# Altium integrated library WR-FPC_rev15a.intlib: 146 symbols (part 1 of 2) (continued)
## WE-ZIF Connector WR-FPC 68712014522
designator C?
WR-FPC 0.50mm SMT ZIF Horizontal Bottom Contact; Manufacturer: Würth Elektronik eiSos GmbH; ComponentLink1 Description: Manufacturer; ComponentLink2 Description: Datasheet; NoPins: 20; Created Date: 28 October 2013; partNo: 68712014522; ComponentLink1URL: http://www.we-online.com; ComponentLink2URL: http://katalog.we-online.de/em/datasheet/6871xx14522.pdf; Created by: Karrer Zheng
footprint 68712014522 (20 pins)
pins: 1, 2, 3, 4, 5, 6, 7, 8, 9, 10, 11, 12, 13, 14, 15, 16, 17, 18, 19, 20

## WE-ZIF Connector WR-FPC 68712214522
designator C?
WR-FPC 0.50mm SMT ZIF Horizontal Bottom Contact; Manufacturer: Würth Elektronik eiSos GmbH; ComponentLink1 Description: Manufacturer; ComponentLink2 Description: Datasheet; NoPins: 22; Created Date: 28 October 2013; partNo: 68712214522; ComponentLink1URL: http://www.we-online.com; ComponentLink2URL: http://katalog.we-online.de/em/datasheet/6871xx14522.pdf; Created by: Karrer Zheng
footprint 68712214522 (22 pins)
pins: 1, 2, 3, 4, 5, 6, 7, 8, 9, 10, 11, 12, 13, 14, 15, 16, 17, 18, 19, 20, 21, 22

## WE-ZIF Connector WR-FPC 68712414522
designator C?
WR-FPC 0.50mm SMT ZIF Horizontal Bottom Contact; Manufacturer: Würth Elektronik eiSos GmbH; ComponentLink1 Description: Manufacturer; ComponentLink2 Description: Datasheet; NoPins: 24; Created Date: 28 October 2013; partNo: 68712414522; ComponentLink1URL: http://www.we-online.com; ComponentLink2URL: http://katalog.we-online.de/em/datasheet/6871xx14522.pdf; Created by: Karrer Zheng
footprint 68712414522 (24 pins)
pins: 1, 2, 3, 4, 5, 6, 7, 8, 9, 10, 11, 12, 13, 14, 15, 16, 17, 18, 19, 20, 21, 22, 23, 24

## WE-ZIF Connector WR-FPC 68712614522
designator C?
WR-FPC 0.50mm SMT ZIF Horizontal Bottom Contact; Manufacturer: Würth Elektronik eiSos GmbH; ComponentLink1 Description: Manufacturer; ComponentLink2 Description: Datasheet; NoPins: 26; Created Date: 28 October 2013; partNo: 68712614522; ComponentLink1URL: http://www.we-online.com; ComponentLink2URL: http://katalog.we-online.de/em/datasheet/6871xx14522.pdf; Created by: Karrer Zheng
footprint 68712614522 (26 pins)
pins: 1, 2, 3, 4, 5, 6, 7, 8, 9, 10, 11, 12, 13, 14, 15, 16, 17, 18, 19, 20, 21, 22, 23, 24, 25, 26

## WE-ZIF Connector WR-FPC 68712814522
designator C?
WR-FPC 0.50mm SMT ZIF Horizontal Bottom Contact; Manufacturer: Würth Elektronik eiSos GmbH; ComponentLink1 Description: Manufacturer; ComponentLink2 Description: Datasheet; NoPins: 28; Created Date: 28 October 2013; partNo: 68712814522; ComponentLink1URL: http://www.we-online.com; ComponentLink2URL: http://katalog.we-online.de/em/datasheet/6871xx14522.pdf; Created by: Karrer Zheng
footprint 68712814522 (28 pins)
pins: 1, 2, 3, 4, 5, 6, 7, 8, 9, 10, 11, 12, 13, 14, 15, 16, 17, 18, 19, 20, 21, 22, 23, 24, 25, 26, 27, 28

## WE-ZIF Connector WR-FPC 68713014522
designator C?
WR-FPC 0.50mm SMT ZIF Horizontal Bottom Contact; Manufacturer: Würth Elektronik eiSos GmbH; ComponentLink1 Description: Manufacturer; ComponentLink2 Description: Datasheet; NoPins: 30; Created Date: 28 October 2013; partNo: 68713014522; ComponentLink1URL: http://www.we-online.com; ComponentLink2URL: http://katalog.we-online.de/em/datasheet/6871xx14522.pdf; Created by: Karrer Zheng
footprint 68713014522 (30 pins)
pins: 1, 2, 3, 4, 5, 6, 7, 8, 9, 10, 11, 12, 13, 14, 15, 16, 17, 18, 19, 20, 21, 22, 23, 24, 25, 26, 27, 28, 29, 30

## WE-ZIF Connector WR-FPC 68713214522
designator C?
WR-FPC 0.50mm SMT ZIF Horizontal Bottom Contact; Manufacturer: Würth Elektronik eiSos GmbH; ComponentLink1 Description: Manufacturer; ComponentLink2 Description: Datasheet; NoPins: 32; Created Date: 28 October 2013; partNo: 68713214522; ComponentLink1URL: http://www.we-online.com; ComponentLink2URL: http://katalog.we-online.de/em/datasheet/6871xx14522.pdf; Created by: Karrer Zheng
footprint 68713214522 (32 pins)
pins: 1, 2, 3, 4, 5, 6, 7, 8, 9, 10, 11, 12, 13, 14, 15, 16, 17, 18, 19, 20, 21, 22, 23, 24, 25, 26, 27, 28, 29, 30, 31, 32

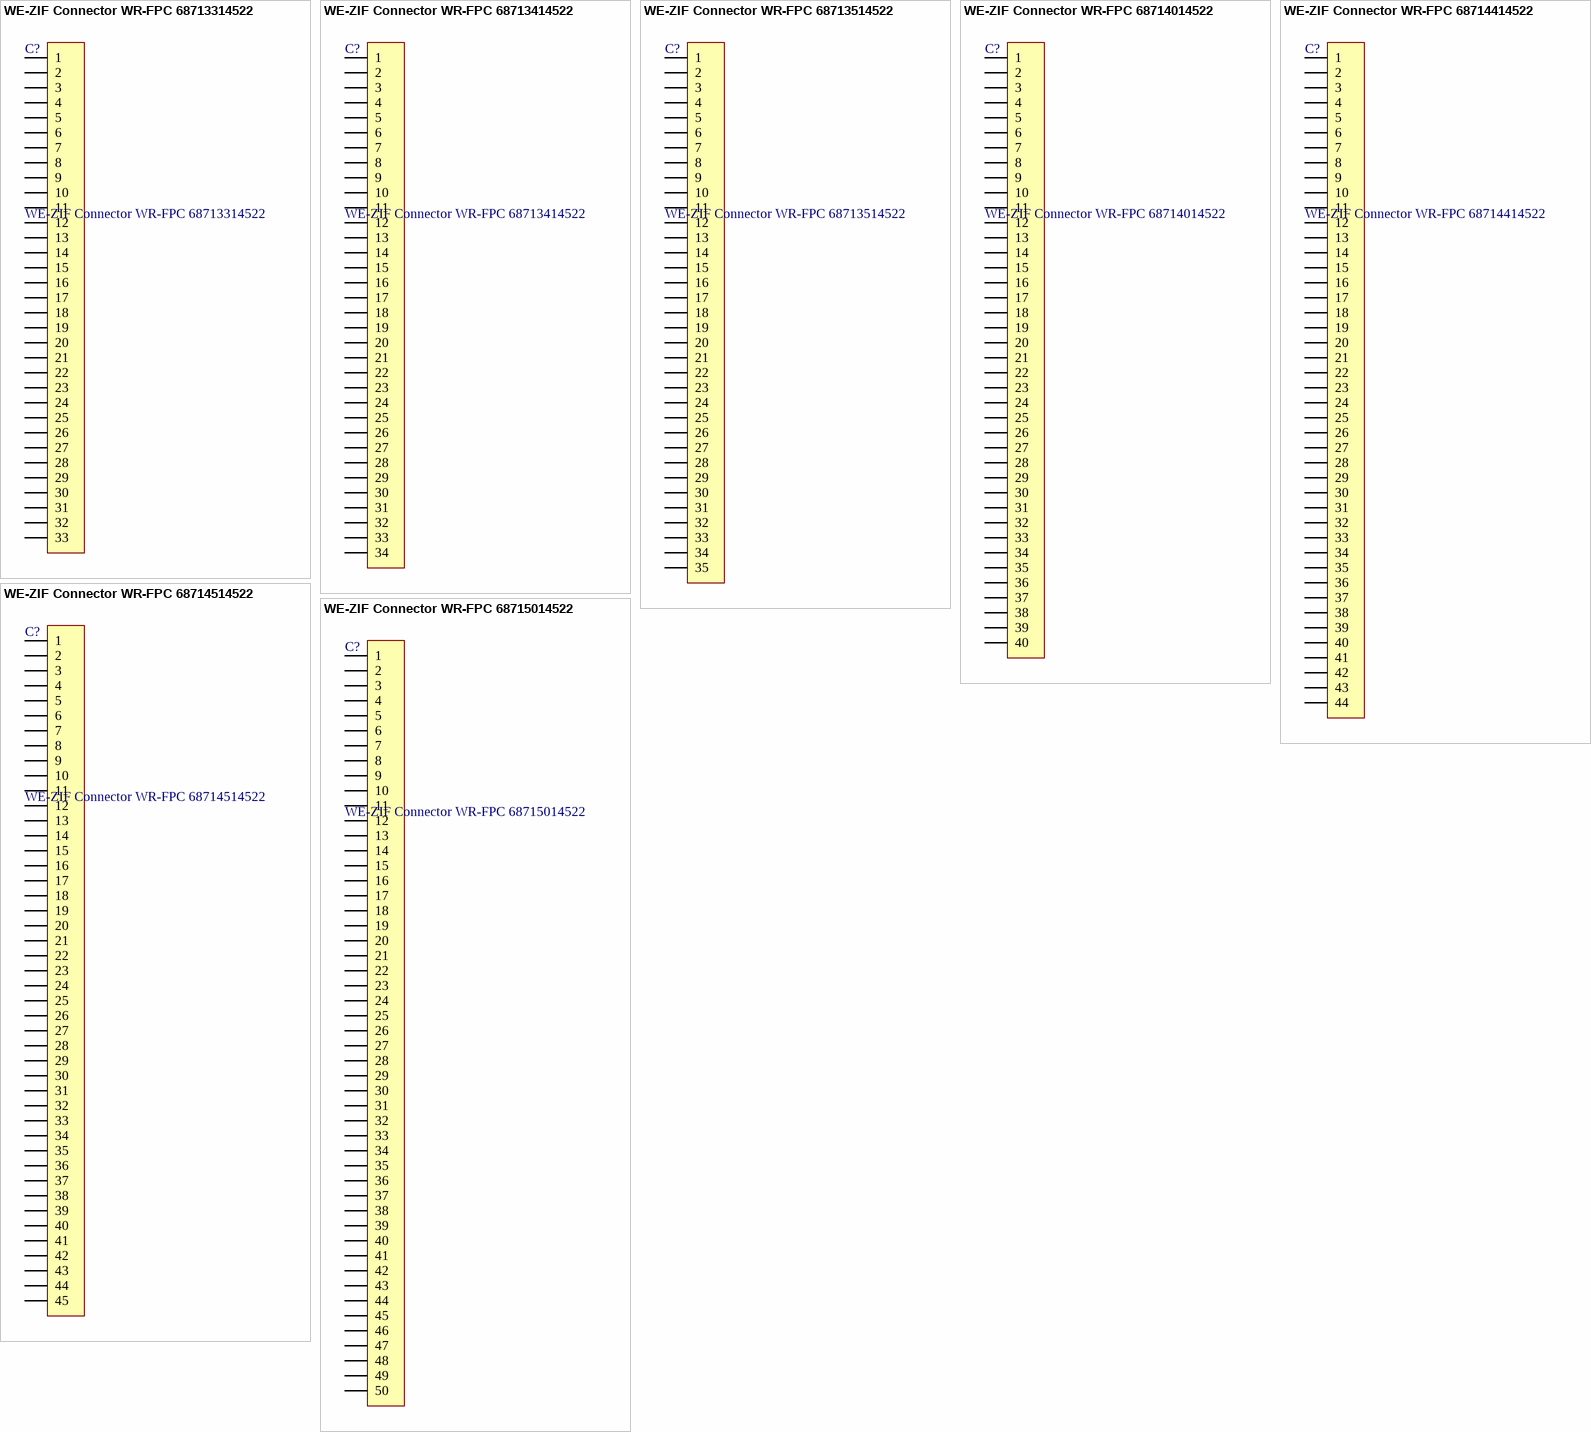
[diagram p7: symbols WE-ZIF Connector WR-FPC 68713314522 to WE-ZIF Connector WR-FPC 68715014522]

## WE-ZIF Connector WR-FPC 68713314522
designator C?
WR-FPC 0.50mm SMT ZIF Horizontal Bottom Contact; Manufacturer: Würth Elektronik eiSos GmbH; ComponentLink1 Description: Manufacturer; ComponentLink2 Description: Datasheet; NoPins: 33; Created Date: 28 October 2013; partNo: 68713314522; ComponentLink1URL: http://www.we-online.com; ComponentLink2URL: http://katalog.we-online.de/em/datasheet/6871xx14522.pdf; Created by: Karrer Zheng
footprint 68713314522 (33 pins)
pins: 1, 2, 3, 4, 5, 6, 7, 8, 9, 10, 11, 12, 13, 14, 15, 16, 17, 18, 19, 20, 21, 22, 23, 24, 25, 26, 27, 28, 29, 30, 31, 32, 33

## WE-ZIF Connector WR-FPC 68713414522
designator C?
WR-FPC 0.50mm SMT ZIF Horizontal Bottom Contact; Manufacturer: Würth Elektronik eiSos GmbH; ComponentLink1 Description: Manufacturer; ComponentLink2 Description: Datasheet; NoPins: 34; Created Date: 28 October 2013; partNo: 68713414522; ComponentLink1URL: http://www.we-online.com; ComponentLink2URL: http://katalog.we-online.de/em/datasheet/6871xx14522.pdf; Created by: Karrer Zheng
footprint 68713414522 (34 pins)
pins: 1, 2, 3, 4, 5, 6, 7, 8, 9, 10, 11, 12, 13, 14, 15, 16, 17, 18, 19, 20, 21, 22, 23, 24, 25, 26, 27, 28, 29, 30, 31, 32, 33, 34

## WE-ZIF Connector WR-FPC 68713514522
designator C?
WR-FPC 0.50mm SMT ZIF Horizontal Bottom Contact; Manufacturer: Würth Elektronik eiSos GmbH; ComponentLink1 Description: Manufacturer; ComponentLink2 Description: Datasheet; NoPins: 35; Created Date: 28 October 2013; partNo: 68713514522; ComponentLink1URL: http://www.we-online.com; ComponentLink2URL: http://katalog.we-online.de/em/datasheet/6871xx14522.pdf; Created by: Karrer Zheng
footprint 68713514522 (35 pins)
pins: 1, 2, 3, 4, 5, 6, 7, 8, 9, 10, 11, 12, 13, 14, 15, 16, 17, 18, 19, 20, 21, 22, 23, 24, 25, 26, 27, 28, 29, 30, 31, 32, 33, 34, 35

## WE-ZIF Connector WR-FPC 68714014522
designator C?
WR-FPC 0.50mm SMT ZIF Horizontal Bottom Contact; Manufacturer: Würth Elektronik eiSos GmbH; ComponentLink1 Description: Manufacturer; ComponentLink2 Description: Datasheet; NoPins: 40; Created Date: 28 October 2013; partNo: 68714014522; ComponentLink1URL: http://www.we-online.com; ComponentLink2URL: http://katalog.we-online.de/em/datasheet/6871xx14522.pdf; Created by: Karrer Zheng
footprint 68714014522 (40 pins)
pins: 1, 2, 3, 4, 5, 6, 7, 8, 9, 10, 11, 12, 13, 14, 15, 16, 17, 18, 19, 20, 21, 22, 23, 24, 25, 26, 27, 28, 29, 30, 31, 32, 33, 34, 35, 36, 37, 38, 39, 40

## WE-ZIF Connector WR-FPC 68714414522
designator C?
WR-FPC 0.50mm SMT ZIF Horizontal Bottom Contact; Manufacturer: Würth Elektronik eiSos GmbH; ComponentLink1 Description: Manufacturer; ComponentLink2 Description: Datasheet; NoPins: 44; Created Date: 28 October 2013; partNo: 68714414522; ComponentLink1URL: http://www.we-online.com; ComponentLink2URL: http://katalog.we-online.de/em/datasheet/6871xx14522.pdf; Created by: Karrer Zheng
footprint 68714414522 (44 pins)
pins: 1, 2, 3, 4, 5, 6, 7, 8, 9, 10, 11, 12, 13, 14, 15, 16, 17, 18, 19, 20, 21, 22, 23, 24, 25, 26, 27, 28, 29, 30, 31, 32, 33, 34, 35, 36, 37, 38, 39, 40, 41, 42, 43, 44

## WE-ZIF Connector WR-FPC 68714514522
designator C?
WR-FPC 0.50mm SMT ZIF Horizontal Bottom Contact; Manufacturer: Würth Elektronik eiSos GmbH; ComponentLink1 Description: Manufacturer; ComponentLink2 Description: Datasheet; NoPins: 45; Created Date: 28 October 2013; partNo: 68714514522; ComponentLink1URL: http://www.we-online.com; ComponentLink2URL: http://katalog.we-online.de/em/datasheet/6871xx14522.pdf; Created by: Karrer Zheng
footprint 68714514522 (45 pins)
pins: 1, 2, 3, 4, 5, 6, 7, 8, 9, 10, 11, 12, 13, 14, 15, 16, 17, 18, 19, 20, 21, 22, 23, 24, 25, 26, 27, 28, 29, 30, 31, 32, 33, 34, 35, 36, 37, 38, 39, 40, 41, 42, 43, 44, 45

## WE-ZIF Connector WR-FPC 68715014522
designator C?
WR-FPC 0.50mm SMT ZIF Horizontal Bottom Contact; Manufacturer: Würth Elektronik eiSos GmbH; ComponentLink1 Description: Manufacturer; ComponentLink2 Description: Datasheet; NoPins: 50; Created Date: 28 October 2013; partNo: 68715014522; ComponentLink1URL: http://www.we-online.com; ComponentLink2URL: http://katalog.we-online.de/em/datasheet/6871xx14522.pdf; Created by: Karrer Zheng
footprint 68715014522 (50 pins)
pins: 1, 2, 3, 4, 5, 6, 7, 8, 9, 10, 11, 12, 13, 14, 15, 16, 17, 18, 19, 20, 21, 22, 23, 24, 25, 26, 27, 28, 29, 30, 31, 32, 33, 34, 35, 36, 37, 38, 39, 40, 41, 42, 43, 44, 45, 46, 47, 48, 49, 50


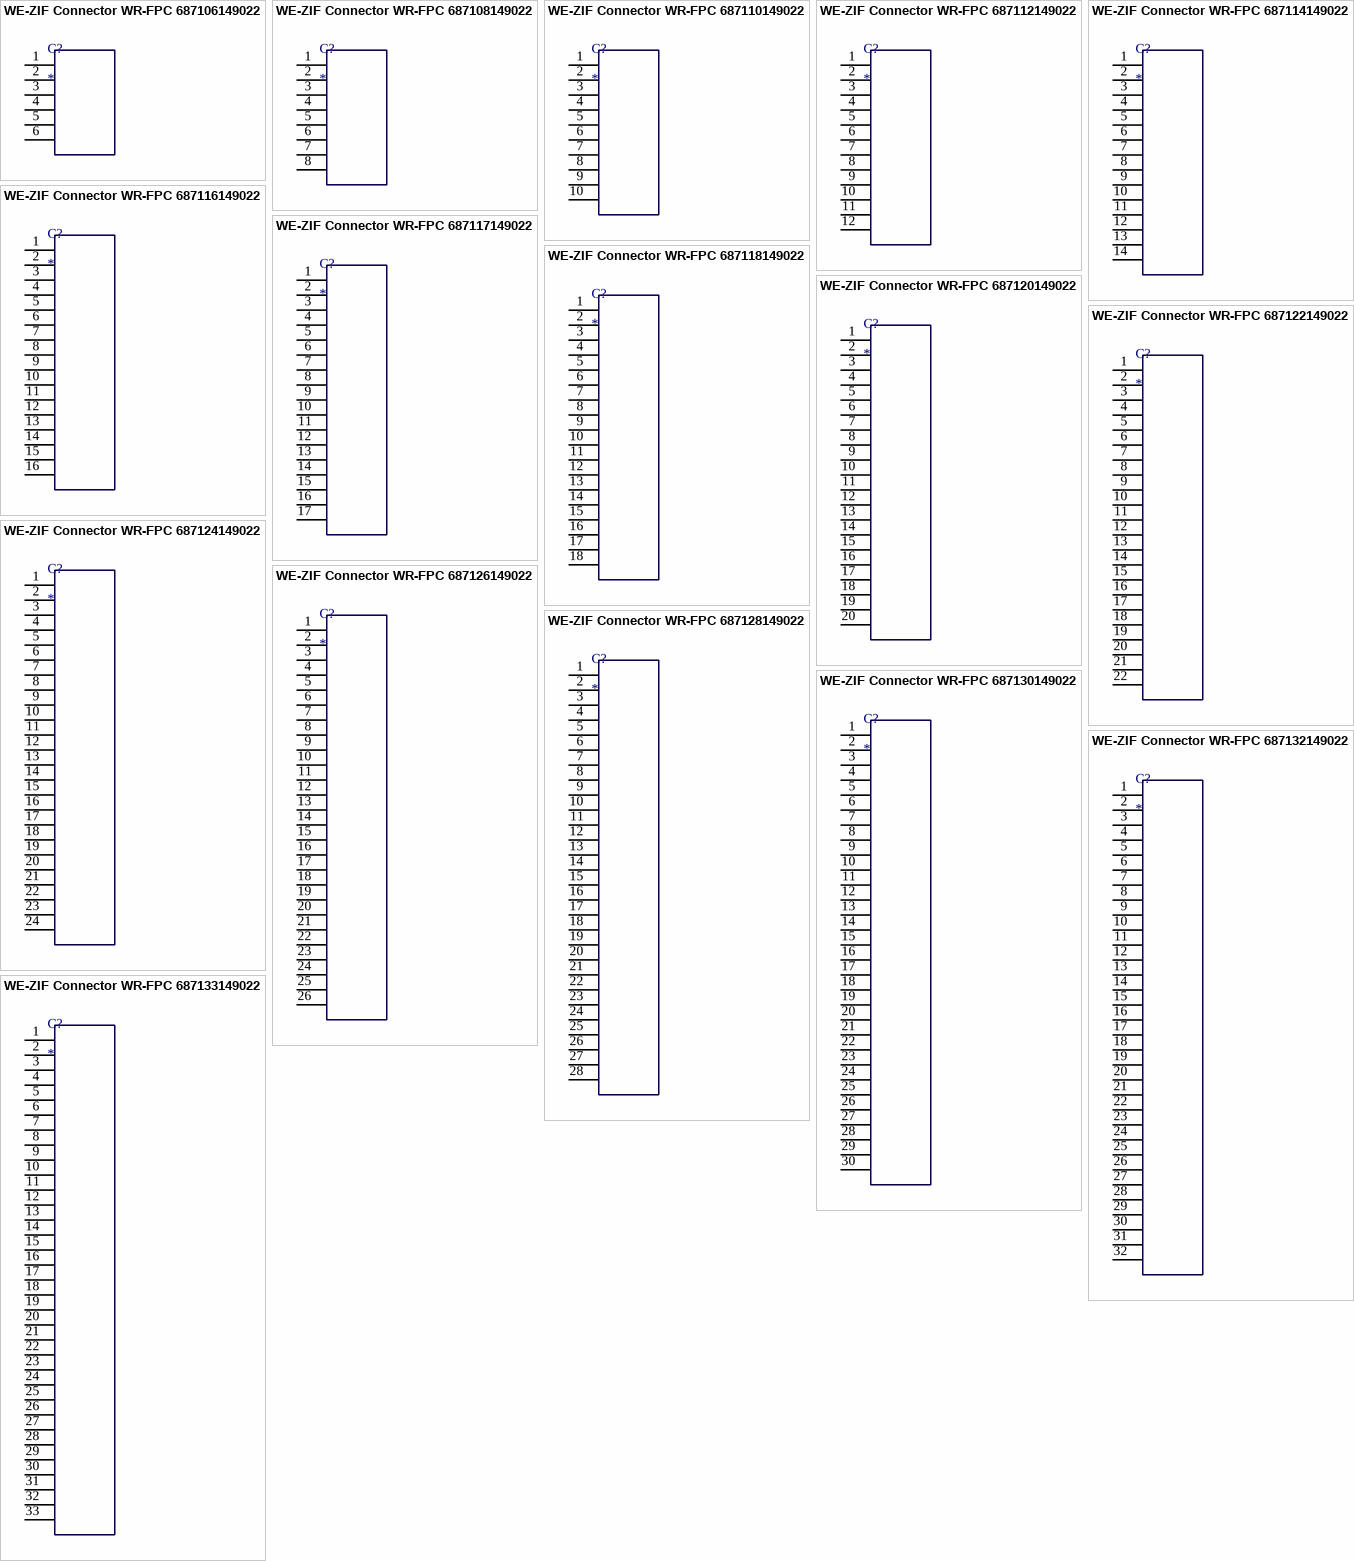
[diagram p8: symbols WE-ZIF Connector WR-FPC 687106149022 to WE-ZIF Connector WR-FPC 687133149022]

## WE-ZIF Connector WR-FPC 687106149022
designator C?
WR-FPC 0.50mm SMT Horiz. Bot. Contact Hinge type; Manufacturer: Würth Elektronik eiSos GmbH; partNo: 687106149022; ComponentLink1 Description: Manufacturer; ComponentLink2 Description: Datasheet; ComponentLink1URL: http://www.we-online.de; ComponentLink2URL: http://katalog.we-online.de/em/datasheet/6871xx149022.pdf; Created by: Karrer Zheng; Created Date: 10/9/2014
footprint 687106149022 (WR-FPC 0.50mm SMT Horiz. Bot. Contact Hinge type WR-FPC 0.50mm 6pins Hinge type SMT Horizontal Bottom Contact)
pins: 1  , 2  , 3  , 4  , 5  , 6  

## WE-ZIF Connector WR-FPC 687108149022
designator C?
WR-FPC 0.50mm SMT Horiz. Bot. Contact Hinge type; Manufacturer: Würth Elektronik eiSos GmbH; partNo: 687108149022; ComponentLink1 Description: Manufacturer; ComponentLink2 Description: Datasheet; ComponentLink1URL: http://www.we-online.de; ComponentLink2URL: http://katalog.we-online.de/em/datasheet/6871xx149022.pdf; Created by: Karrer Zheng; Created Date: 10/9/2014
footprint 687108149022
pins: 1  , 2  , 3  , 4  , 5  , 6  , 7  , 8  

## WE-ZIF Connector WR-FPC 687110149022
designator C?
WR-FPC 0.50mm SMT Horiz. Bot. Contact Hinge type; Manufacturer: Würth Elektronik eiSos GmbH; partNo: 687110149022; ComponentLink1 Description: Manufacturer; ComponentLink2 Description: Datasheet; ComponentLink1URL: http://www.we-online.de; ComponentLink2URL: http://katalog.we-online.de/em/datasheet/6871xx149022.pdf; Created by: Karrer Zheng; Created Date: 10/9/2014
footprint 687110149022
pins: 1  , 2  , 3  , 4  , 5  , 6  , 7  , 8  , 9  , 10  

## WE-ZIF Connector WR-FPC 687112149022
designator C?
WR-FPC 0.50mm SMT Horiz. Bot. Contact Hinge type; Manufacturer: Würth Elektronik eiSos GmbH; partNo: 687112149022; ComponentLink1 Description: Manufacturer; ComponentLink2 Description: Datasheet; ComponentLink1URL: http://www.we-online.de; ComponentLink2URL: http://katalog.we-online.de/em/datasheet/6871xx149022.pdf; Created by: Karrer Zheng; Created Date: 10/9/2014
footprint 687112149022
pins: 1  , 2  , 3  , 4  , 5  , 6  , 7  , 8  , 9  , 10  , 11  , 12  

## WE-ZIF Connector WR-FPC 687114149022
designator C?
WR-FPC 0.50mm SMT Horiz. Bot. Contact Hinge type; Manufacturer: Würth Elektronik eiSos GmbH; partNo: 687114149022; ComponentLink1 Description: Manufacturer; ComponentLink2 Description: Datasheet; ComponentLink1URL: http://www.we-online.de; ComponentLink2URL: http://katalog.we-online.de/em/datasheet/6871xx149022.pdf; Created by: Karrer Zheng; Created Date: 10/9/2014
footprint 687114149022
pins: 1  , 2  , 3  , 4  , 5  , 6  , 7  , 8  , 9  , 10  , 11  , 12  , 13  , 14  

## WE-ZIF Connector WR-FPC 687116149022
designator C?
WR-FPC 0.50mm SMT Horiz. Bot. Contact Hinge type; Manufacturer: Würth Elektronik eiSos GmbH; partNo: 687116149022; ComponentLink1 Description: Manufacturer; ComponentLink2 Description: Datasheet; ComponentLink1URL: http://www.we-online.de; ComponentLink2URL: http://katalog.we-online.de/em/datasheet/6871xx149022.pdf; Created by: Karrer Zheng; Created Date: 10/9/2014
footprint 687116149022
pins: 1  , 2  , 3  , 4  , 5  , 6  , 7  , 8  , 9  , 10  , 11  , 12  , 13  , 14  , 15  , 16  

## WE-ZIF Connector WR-FPC 687117149022
designator C?
WR-FPC 0.50mm SMT Horiz. Bot. Contact Hinge type; Manufacturer: Würth Elektronik eiSos GmbH; partNo: 687117149022; ComponentLink1 Description: Manufacturer; ComponentLink2 Description: Datasheet; ComponentLink1URL: http://www.we-online.de; ComponentLink2URL: http://katalog.we-online.de/em/datasheet/6871xx149022.pdf; Created by: Karrer Zheng; Created Date: 10/9/2014
footprint 687117149022
pins: 1  , 2  , 3  , 4  , 5  , 6  , 7  , 8  , 9  , 10  , 11  , 12  , 13  , 14  , 15  , 16  , 17  

## WE-ZIF Connector WR-FPC 687118149022
designator C?
WR-FPC 0.50mm SMT Horiz. Bot. Contact Hinge type; Manufacturer: Würth Elektronik eiSos GmbH; partNo: 687118149022; ComponentLink1 Description: Manufacturer; ComponentLink2 Description: Datasheet; ComponentLink1URL: http://www.we-online.de; ComponentLink2URL: http://katalog.we-online.de/em/datasheet/6871xx149022.pdf; Created by: Karrer Zheng; Created Date: 10/9/2014
footprint 687118149022
pins: 1  , 2  , 3  , 4  , 5  , 6  , 7  , 8  , 9  , 10  , 11  , 12  , 13  , 14  , 15  , 16  , 17  , 18  

## WE-ZIF Connector WR-FPC 687120149022
designator C?
WR-FPC 0.50mm SMT Horiz. Bot. Contact Hinge type; Manufacturer: Würth Elektronik eiSos GmbH; partNo: 687120149022; ComponentLink1 Description: Manufacturer; ComponentLink2 Description: Datasheet; ComponentLink1URL: http://www.we-online.de; ComponentLink2URL: http://katalog.we-online.de/em/datasheet/6871xx149022.pdf; Created by: Karrer Zheng; Created Date: 10/9/2014
footprint 687120149022
pins: 1  , 2  , 3  , 4  , 5  , 6  , 7  , 8  , 9  , 10  , 11  , 12  , 13  , 14  , 15  , 16  , 17  , 18  , 19  , 20  

## WE-ZIF Connector WR-FPC 687122149022
designator C?
WR-FPC 0.50mm SMT Horiz. Bot. Contact Hinge type; Manufacturer: Würth Elektronik eiSos GmbH; partNo: 687122149022; ComponentLink1 Description: Manufacturer; ComponentLink2 Description: Datasheet; ComponentLink1URL: http://www.we-online.de; ComponentLink2URL: http://katalog.we-online.de/em/datasheet/6871xx149022.pdf; Created by: Karrer Zheng; Created Date: 10/9/2014
footprint 687122149022
pins: 1  , 2  , 3  , 4  , 5  , 6  , 7  , 8  , 9  , 10  , 11  , 12  , 13  , 14  , 15  , 16  , 17  , 18  , 19  , 20  , 21  , 22  

## WE-ZIF Connector WR-FPC 687124149022
designator C?
WR-FPC 0.50mm SMT Horiz. Bot. Contact Hinge type; Manufacturer: Würth Elektronik eiSos GmbH; partNo: 687124149022; ComponentLink1 Description: Manufacturer; ComponentLink2 Description: Datasheet; ComponentLink1URL: http://www.we-online.de; ComponentLink2URL: http://katalog.we-online.de/em/datasheet/6871xx149022.pdf; Created by: Karrer Zheng; Created Date: 10/9/2014
footprint 687124149022
pins: 1  , 2  , 3  , 4  , 5  , 6  , 7  , 8  , 9  , 10  , 11  , 12  , 13  , 14  , 15  , 16  , 17  , 18  , 19  , 20  , 21  , 22  , 23  , 24  

## WE-ZIF Connector WR-FPC 687126149022
designator C?
WR-FPC 0.50mm SMT Horiz. Bot. Contact Hinge type; Manufacturer: Würth Elektronik eiSos GmbH; partNo: 687126149022; ComponentLink1 Description: Manufacturer; ComponentLink2 Description: Datasheet; ComponentLink1URL: http://www.we-online.de; ComponentLink2URL: http://katalog.we-online.de/em/datasheet/6871xx149022.pdf; Created by: Karrer Zheng; Created Date: 10/9/2014
footprint 687126149022
pins: 1  , 2  , 3  , 4  , 5  , 6  , 7  , 8  , 9  , 10  , 11  , 12  , 13  , 14  , 15  , 16  , 17  , 18  , 19  , 20  , 21  , 22  , 23  , 24  , 25  , 26  

## WE-ZIF Connector WR-FPC 687128149022
designator C?
WR-FPC 0.50mm SMT Horiz. Bot. Contact Hinge type; Manufacturer: Würth Elektronik eiSos GmbH; partNo: 687128149022; ComponentLink1 Description: Manufacturer; ComponentLink2 Description: Datasheet; ComponentLink1URL: http://www.we-online.de; ComponentLink2URL: http://katalog.we-online.de/em/datasheet/6871xx149022.pdf; Created by: Karrer Zheng; Created Date: 10/9/2014
footprint 687128149022
pins: 1  , 2  , 3  , 4  , 5  , 6  , 7  , 8  , 9  , 10  , 11  , 12  , 13  , 14  , 15  , 16  , 17  , 18  , 19  , 20  , 21  , 22  , 23  , 24  , 25  , 26  , 27  , 28  

## WE-ZIF Connector WR-FPC 687130149022
designator C?
WR-FPC 0.50mm SMT Horiz. Bot. Contact Hinge type; Manufacturer: Würth Elektronik eiSos GmbH; partNo: 687130149022; ComponentLink1 Description: Manufacturer; ComponentLink2 Description: Datasheet; ComponentLink1URL: http://www.we-online.de; ComponentLink2URL: http://katalog.we-online.de/em/datasheet/6871xx149022.pdf; Created by: Karrer Zheng; Created Date: 10/9/2014
footprint 687130149022
pins: 1  , 2  , 3  , 4  , 5  , 6  , 7  , 8  , 9  , 10  , 11  , 12  , 13  , 14  , 15  , 16  , 17  , 18  , 19  , 20  , 21  , 22  , 23  , 24  , 25  , 26  , 27  , 28  , 29  , 30  

## WE-ZIF Connector WR-FPC 687132149022
designator C?
WR-FPC 0.50mm SMT Horiz. Bot. Contact Hinge type; Manufacturer: Würth Elektronik eiSos GmbH; partNo: 687132149022; ComponentLink1 Description: Manufacturer; ComponentLink2 Description: Datasheet; ComponentLink1URL: http://www.we-online.de; ComponentLink2URL: http://katalog.we-online.de/em/datasheet/6871xx149022.pdf; Created by: Karrer Zheng; Created Date: 10/9/2014
footprint 687132149022
pins: 1  , 2  , 3  , 4  , 5  , 6  , 7  , 8  , 9  , 10  , 11  , 12  , 13  , 14  , 15  , 16  , 17  , 18  , 19  , 20  , 21  , 22  , 23  , 24  , 25  , 26  , 27  , 28  , 29  , 30  , 31  , 32  

## WE-ZIF Connector WR-FPC 687133149022
designator C?
WR-FPC 0.50mm SMT Horiz. Bot. Contact Hinge type; Manufacturer: Würth Elektronik eiSos GmbH; partNo: 687133149022; ComponentLink1 Description: Manufacturer; ComponentLink2 Description: Datasheet; ComponentLink1URL: http://www.we-online.de; ComponentLink2URL: http://katalog.we-online.de/em/datasheet/6871xx149022.pdf; Created by: Karrer Zheng; Created Date: 10/9/2014
footprint 687133149022
pins: 1  , 2  , 3  , 4  , 5  , 6  , 7  , 8  , 9  , 10  , 11  , 12  , 13  , 14  , 15  , 16  , 17  , 18  , 19  , 20  , 21  , 22  , 23  , 24  , 25  , 26  , 27  , 28  , 29  , 30  , 31  , 32  , 33  

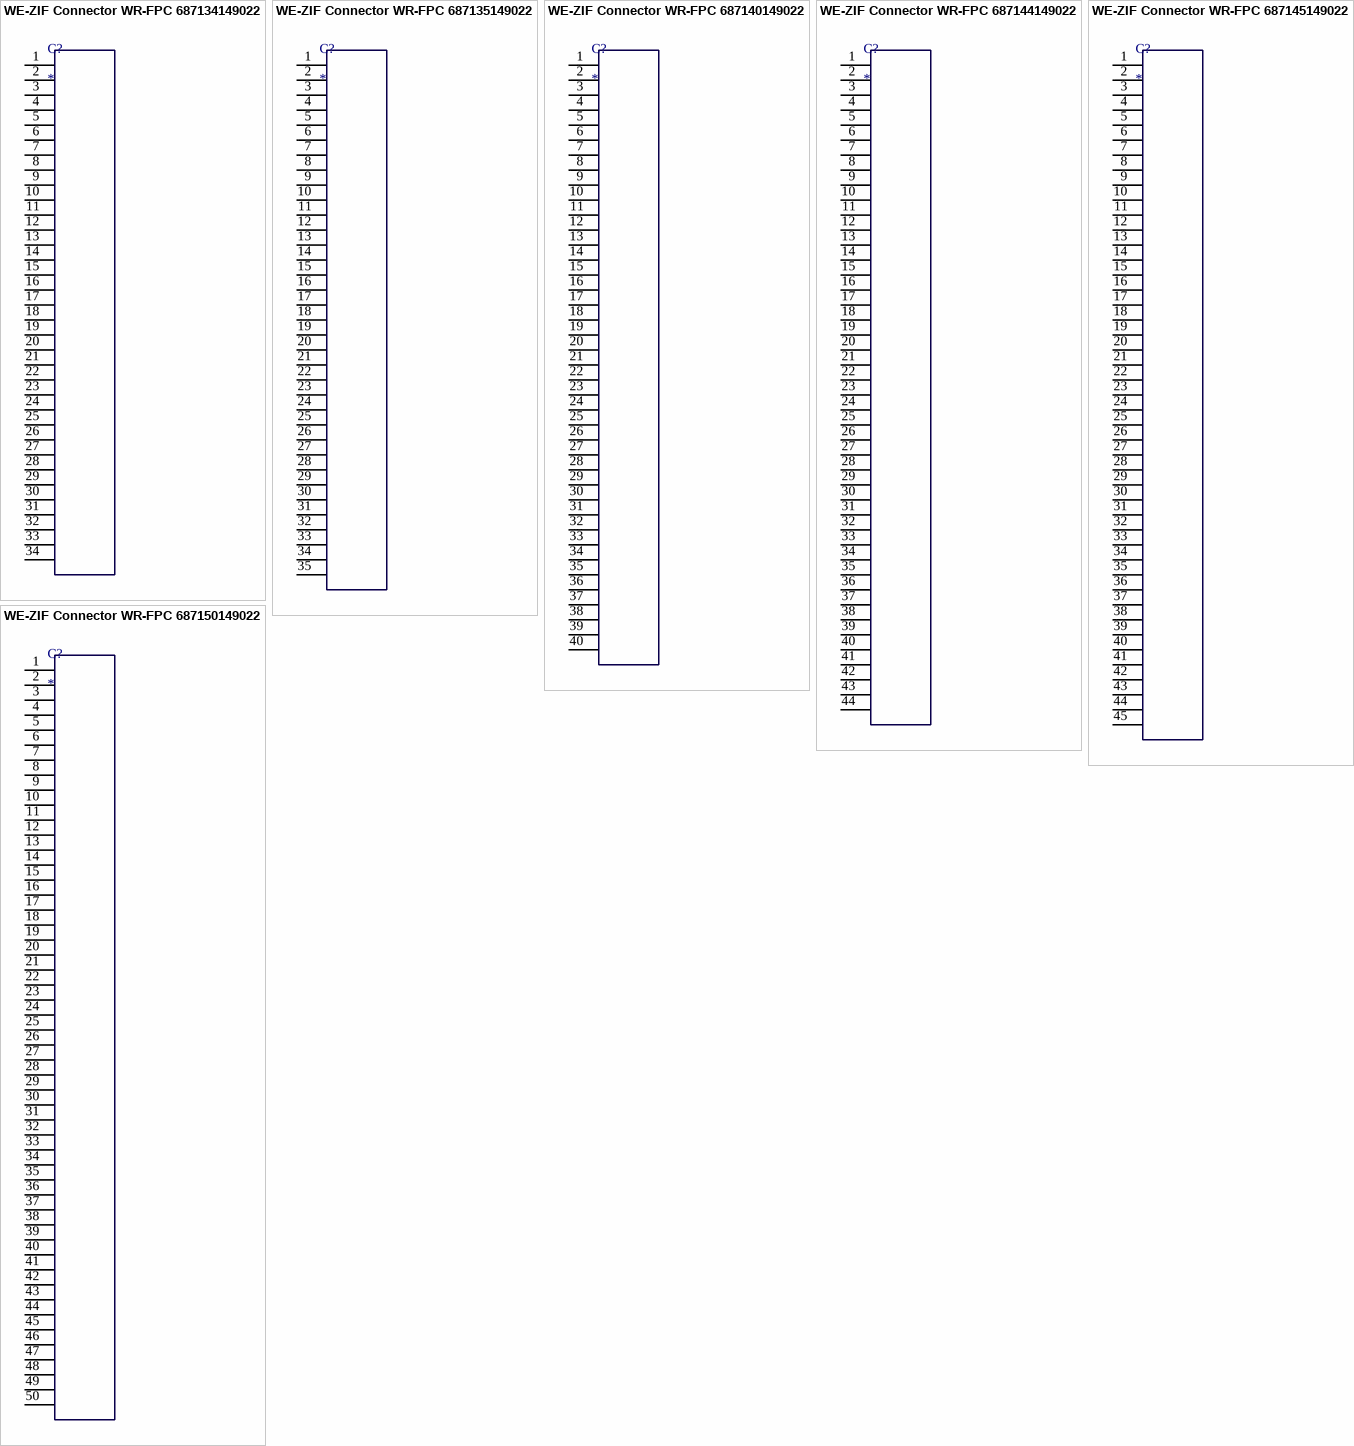
[diagram p9: symbols WE-ZIF Connector WR-FPC 687134149022 to WE-ZIF Connector WR-FPC 687150149022]

## WE-ZIF Connector WR-FPC 687134149022
designator C?
WR-FPC 0.50mm SMT Horiz. Bot. Contact Hinge type; Manufacturer: Würth Elektronik eiSos GmbH; partNo: 687134149022; ComponentLink1 Description: Manufacturer; ComponentLink2 Description: Datasheet; ComponentLink1URL: http://www.we-online.de; ComponentLink2URL: http://katalog.we-online.de/em/datasheet/6871xx149022.pdf; Created by: Karrer Zheng; Created Date: 10/9/2014
footprint 687134149022
pins: 1  , 2  , 3  , 4  , 5  , 6  , 7  , 8  , 9  , 10  , 11  , 12  , 13  , 14  , 15  , 16  , 17  , 18  , 19  , 20  , 21  , 22  , 23  , 24  , 25  , 26  , 27  , 28  , 29  , 30  , 31  , 32  , 33  , 34  

## WE-ZIF Connector WR-FPC 687135149022
designator C?
WR-FPC 0.50mm SMT Horiz. Bot. Contact Hinge type; Manufacturer: Würth Elektronik eiSos GmbH; partNo: 687135149022; ComponentLink1 Description: Manufacturer; ComponentLink2 Description: Datasheet; ComponentLink1URL: http://www.we-online.de; ComponentLink2URL: http://katalog.we-online.de/em/datasheet/6871xx149022.pdf; Created by: Karrer Zheng; Created Date: 10/9/2014
footprint 687135149022
pins: 1  , 2  , 3  , 4  , 5  , 6  , 7  , 8  , 9  , 10  , 11  , 12  , 13  , 14  , 15  , 16  , 17  , 18  , 19  , 20  , 21  , 22  , 23  , 24  , 25  , 26  , 27  , 28  , 29  , 30  , 31  , 32  , 33  , 34  , 35  

## WE-ZIF Connector WR-FPC 687140149022
designator C?
WR-FPC 0.50mm SMT Horiz. Bot. Contact Hinge type; Manufacturer: Würth Elektronik eiSos GmbH; partNo: 687140149022; ComponentLink1 Description: Manufacturer; ComponentLink2 Description: Datasheet; ComponentLink1URL: http://www.we-online.de; ComponentLink2URL: http://katalog.we-online.de/em/datasheet/6871xx149022.pdf; Created by: Karrer Zheng; Created Date: 10/9/2014
footprint 687140149022
pins: 1  , 2  , 3  , 4  , 5  , 6  , 7  , 8  , 9  , 10  , 11  , 12  , 13  , 14  , 15  , 16  , 17  , 18  , 19  , 20  , 21  , 22  , 23  , 24  , 25  , 26  , 27  , 28  , 29  , 30  , 31  , 32  , 33  , 34  , 35  , 36  , 37  , 38  , 39  , 40  

## WE-ZIF Connector WR-FPC 687144149022
designator C?
WR-FPC 0.50mm SMT Horiz. Bot. Contact Hinge type; Manufacturer: Würth Elektronik eiSos GmbH; partNo: 687144149022; ComponentLink1 Description: Manufacturer; ComponentLink2 Description: Datasheet; ComponentLink1URL: http://www.we-online.de; ComponentLink2URL: http://katalog.we-online.de/em/datasheet/6871xx149022.pdf; Created by: Karrer Zheng; Created Date: 10/9/2014
footprint 687144149022
pins: 1  , 2  , 3  , 4  , 5  , 6  , 7  , 8  , 9  , 10  , 11  , 12  , 13  , 14  , 15  , 16  , 17  , 18  , 19  , 20  , 21  , 22  , 23  , 24  , 25  , 26  , 27  , 28  , 29  , 30  , 31  , 32  , 33  , 34  , 35  , 36  , 37  , 38  , 39  , 40  , 41  , 42  , 43  , 44  

## WE-ZIF Connector WR-FPC 687145149022
designator C?
WR-FPC 0.50mm SMT Horiz. Bot. Contact Hinge type; Manufacturer: Würth Elektronik eiSos GmbH; partNo: 687145149022; ComponentLink1 Description: Manufacturer; ComponentLink2 Description: Datasheet; ComponentLink1URL: http://www.we-online.de; ComponentLink2URL: http://katalog.we-online.de/em/datasheet/6871xx149022.pdf; Created by: Karrer Zheng; Created Date: 10/9/2014
footprint 687145149022
pins: 1  , 2  , 3  , 4  , 5  , 6  , 7  , 8  , 9  , 10  , 11  , 12  , 13  , 14  , 15  , 16  , 17  , 18  , 19  , 20  , 21  , 22  , 23  , 24  , 25  , 26  , 27  , 28  , 29  , 30  , 31  , 32  , 33  , 34  , 35  , 36  , 37  , 38  , 39  , 40  , 41  , 42  , 43  , 44  , 45  

## WE-ZIF Connector WR-FPC 687150149022
designator C?
WR-FPC 0.50mm SMT Horiz. Bot. Contact Hinge type; Manufacturer: Würth Elektronik eiSos GmbH; partNo: 687150149022; ComponentLink1 Description: Manufacturer; ComponentLink2 Description: Datasheet; ComponentLink1URL: http://www.we-online.de; ComponentLink2URL: http://katalog.we-online.de/em/datasheet/6871xx149022.pdf; Created by: Karrer Zheng; Created Date: 10/9/2014
footprint 687150149022
pins: 1  , 2  , 3  , 4  , 5  , 6  , 7  , 8  , 9  , 10  , 11  , 12  , 13  , 14  , 15  , 16  , 17  , 18  , 19  , 20  , 21  , 22  , 23  , 24  , 25  , 26  , 27  , 28  , 29  , 30  , 31  , 32  , 33  , 34  , 35  , 36  , 37  , 38  , 39  , 40  , 41  , 42  , 43  , 44  , 45  , 46  , 47  , 48  , 49  , 50  


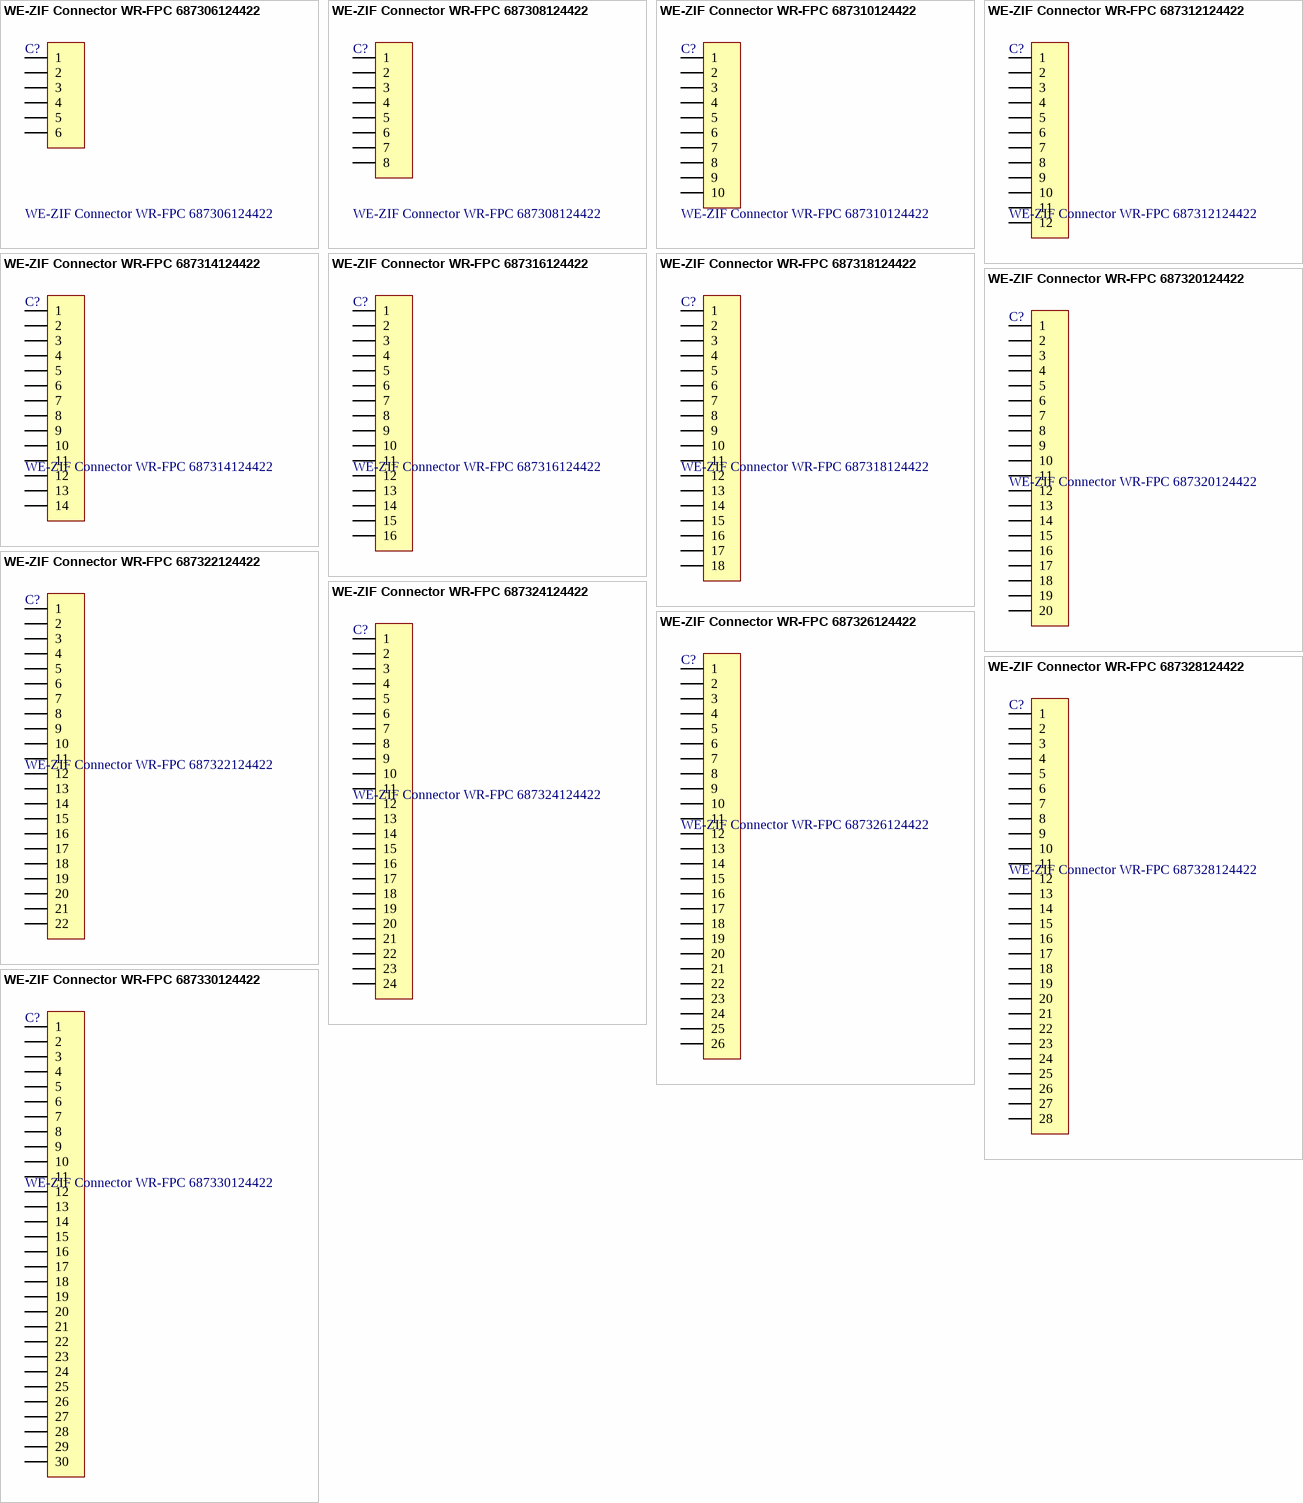
[diagram p10: symbols WE-ZIF Connector WR-FPC 687306124422 to WE-ZIF Connector WR-FPC 687330124422]

## WE-ZIF Connector WR-FPC 687306124422
designator C?
WR-FPC 0.50mm SMT ZIF Vertical Type A; Manufacturer: Würth Elektronik eiSos GmbH; ComponentLink1 Description: Manufacturer; ComponentLink2 Description: Datasheet; NoPins: 06; Created Date: 29 October 2013; partNo: 687306124422; ComponentLink1URL: http://www.we-online.com; ComponentLink2URL: http://katalog.we-online.de/em/datasheet/6873xx124422.pdf; Created by: Karrer Zheng
footprint 687306124422 (6 pins T&R with Cap)
pins: 1, 2, 3, 4, 5, 6

## WE-ZIF Connector WR-FPC 687308124422
designator C?
WR-FPC 0.50mm SMT ZIF Vertical Type A; Manufacturer: Würth Elektronik eiSos GmbH; ComponentLink1 Description: Manufacturer; ComponentLink2 Description: Datasheet; NoPins: 08; Created Date: 29 October 2013; partNo: 687308124422; ComponentLink1URL: http://www.we-online.com; ComponentLink2URL: http://katalog.we-online.de/em/datasheet/6873xx124422.pdf; Created by: Karrer Zheng
footprint 687308124422 (8 pins T&R with Cap)
pins: 1, 2, 3, 4, 5, 6, 7, 8

## WE-ZIF Connector WR-FPC 687310124422
designator C?
WR-FPC 0.50mm SMT ZIF Vertical Type A; Manufacturer: Würth Elektronik eiSos GmbH; ComponentLink1 Description: Manufacturer; ComponentLink2 Description: Datasheet; NoPins: 10; Created Date: 29 October 2013; partNo: 687310124422; ComponentLink1URL: http://www.we-online.com; ComponentLink2URL: http://katalog.we-online.de/em/datasheet/6873xx124422.pdf; Created by: Karrer Zheng
footprint 687310124422 (10 pins T&R with Cap)
pins: 1, 2, 3, 4, 5, 6, 7, 8, 9, 10

## WE-ZIF Connector WR-FPC 687312124422
designator C?
WR-FPC 0.50mm SMT ZIF Vertical Type A; Manufacturer: Würth Elektronik eiSos GmbH; ComponentLink1 Description: Manufacturer; ComponentLink2 Description: Datasheet; NoPins: 12; Created Date: 29 October 2013; partNo: 687312124422; ComponentLink1URL: http://www.we-online.com; ComponentLink2URL: http://katalog.we-online.de/em/datasheet/6873xx124422.pdf; Created by: Karrer Zheng
footprint 687312124422 (12 pins T&R with Cap)
pins: 1, 2, 3, 4, 5, 6, 7, 8, 9, 10, 11, 12

## WE-ZIF Connector WR-FPC 687314124422
designator C?
WR-FPC 0.50mm SMT ZIF Vertical Type A; Manufacturer: Würth Elektronik eiSos GmbH; ComponentLink1 Description: Manufacturer; ComponentLink2 Description: Datasheet; NoPins: 14; Created Date: 29 October 2013; partNo: 687314124422; ComponentLink1URL: http://www.we-online.com; ComponentLink2URL: http://katalog.we-online.de/em/datasheet/6873xx124422.pdf; Created by: Karrer Zheng
footprint 687314124422 (14 pins T&R with Cap)
pins: 1, 2, 3, 4, 5, 6, 7, 8, 9, 10, 11, 12, 13, 14